# Altium footprint library HSD_connectors.PcbLib: 59 footprints (part 2 of 7)
Each footprint in its own frame and in the unit in brackets; x right, y up, seen from the top. Pads: shape width x height; smd on the part's side, far side on the other; paste and mask are expansions set on the pad; w line width, h text height; cw(c..) or ccw(c..) is an arc to the next point about the centre after c.
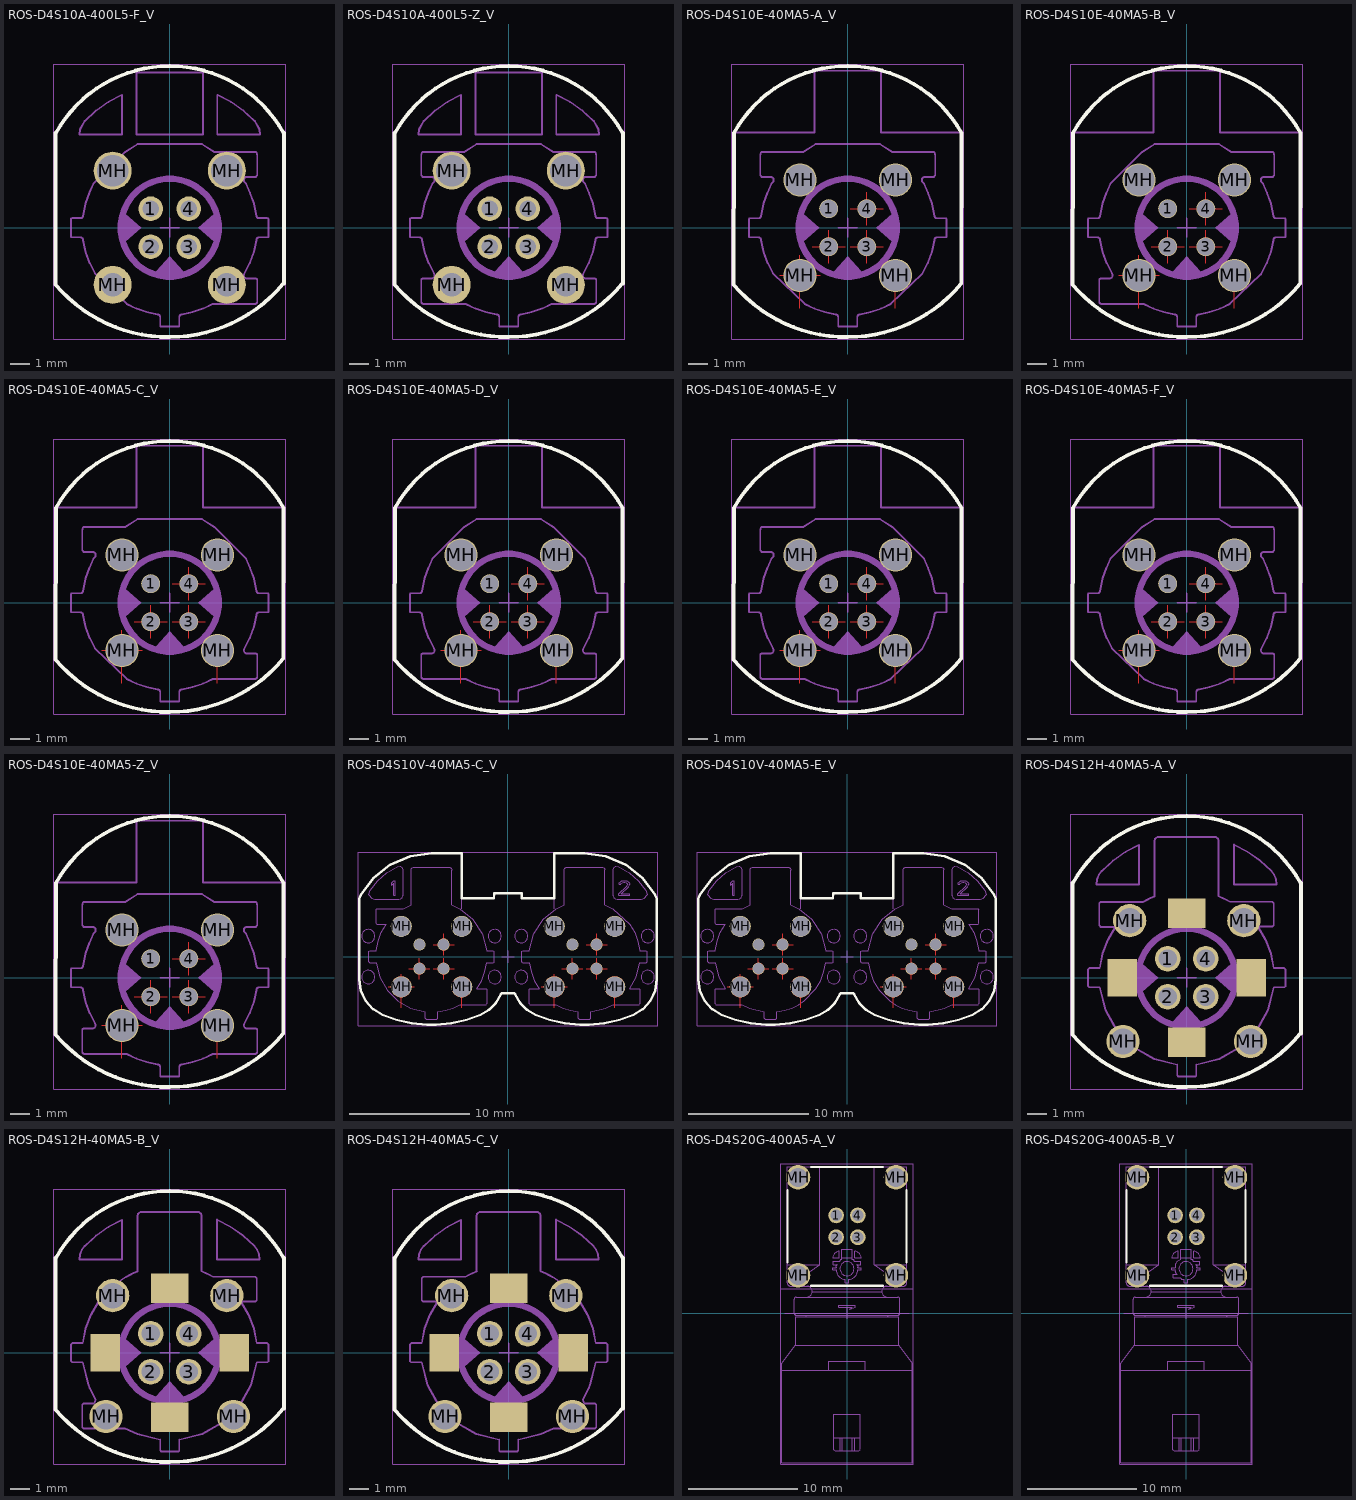
[diagram p1: the footprints below, top view; thin cyan lines are the x and y axes]

## ROS-D4S10A-400L5-F_V [mm] "HSD Straight Plug, 12x14.15x15.4mm, Rosenberger Recommended"
height 15.4
pads (8):
  round 1.3 hole 0.85: 1(-1,1) 2(-1,-1) 3(1,-1) 4(1,1)
  round 2 hole 1.25: MH(-3,-3) MH(3,-3)
  round 2 hole 1.65: MH(-3,3) MH(3,3)
Top Overlay:
  lines w0.2: -6,4.989 -6,-3 ccw(c-0.039,2.086) 5.965,-2.95 ; -5.98,4.989 cw(c0,1.651) 5.981,4.989 ; 6,-2.95 6,4.989
Mechanical 13:
  drawing of 99 lines, arcs and shapes, not listed
  text ".Designator" at -1.639,5.631 h2.69
Mechanical 15:
  lines w0.05: -6.1,-5.85 6.1,-5.85 6.1,8.6 -6.1,8.6 -6.1,-5.85
  lines w0.1: -0.5,0 0.5,0 ; 0,-0.5 0,0.5
3D body "d4s10a-400L5-F.stp": height 15.25, standoff -3.5, extent -5.999,-5.649 6.001,8.501

## ROS-D4S10A-400L5-Z_V [mm] "HSD Straight Plug, 12x14.15x15.4mm, Rosenberger Recommended"
height 15.4
pads (8):
  round 1.3 hole 0.85: 1(-1,1) 2(-1,-1) 3(1,-1) 4(1,1)
  round 2 hole 1.25: MH(-3,-3) MH(3,-3)
  round 2 hole 1.65: MH(-3,3) MH(3,3)
Top Overlay:
  lines w0.2: -6,4.989 -6,-3 ccw(c-0.039,2.086) 5.965,-2.95 ; -5.98,4.989 cw(c0,1.651) 5.981,4.989 ; 6,-2.95 6,4.989
Mechanical 13:
  drawing of 123 lines, arcs and shapes, not listed
  text ".Designator" at -1.639,5.758 h2.69
Mechanical 15:
  lines w0.05: -6.1,-5.85 -6.1,8.6 6.1,8.6 6.1,-5.85 -6.1,-5.85
  lines w0.1: -0.5,0 0.5,0 ; 0,-0.5 0,0.5
3D body "d4s10a-400L5-Z.stp": height 15.25, standoff -3.5, extent -5.999,-5.649 6.001,8.501

## ROS-D4S10E-40MA5-A_V [mm] "HSD Straight Plug, Pin in Paste, 14.15x12.00x15.40 mm, Rosenberger Recommended"
height 15.4
pads (8):
  round 1 hole 0.9: 1(-1,1) 2(-1,-1) 3(1,-1) 4(1,1)
  round 1.75 hole 1.65: MH(-2.51,-2.51) MH(-2.51,2.51) MH(2.51,-2.51) MH(2.51,2.51)
Top Layer:
  lines w0.043: -3.57,-2.51 -3.335,-2.51 ; -2.51,-4.24 -2.51,-3.335 ; -2.51,-1.685 -2.51,-1.45 ; -1.875,-1 -1.45,-1 ; -1.685,-2.51 -1.45,-2.51 ; -1,-1.875 -1,-1.45 ; -1,-0.55 -1,-0.125 ; -0.55,-1 -0.125,-1 ; 0.125,-1 0.55,-1 ; 0.125,1 0.55,1 ; 1,-1.875 1,-1.45 ; 1,-0.55 1,-0.125 ; 1,0.125 1,0.55 ; 1,1.45 1,1.875 ; 1.45,-1 1.875,-1 ; 1.45,1 1.875,1 ; 2.51,-4.24 2.51,-3.335 ; -3.325,-2.51 ccw(c-2.51,-2.51) -2.51,-3.325 ccw(c-2.51,-2.51) -1.695,-2.51 ccw(c-2.51,-2.51) -2.51,-1.695 ccw(c-2.51,-2.51) -3.325,-2.51 ; -1.44,-1 ccw(c-1,-1) -1,-1.44 ccw(c-1,-1) -0.56,-1 ccw(c-1,-1) -1,-0.56 ccw(c-1,-1) -1.44,-1 ; 0.56,-1 ccw(c1,-1) 1,-1.44 ccw(c1,-1) 1.44,-1 ccw(c1,-1) 1,-0.56 ccw(c1,-1) 0.56,-1 ; 0.56,1 cw(c1,1) 1,1.44 cw(c1,1) 1.44,1 cw(c1,1) 1,0.56 cw(c1,1) 0.56,1 ; 1.695,-2.51 cw(c2.51,-2.51) 2.51,-1.695 cw(c2.51,-2.51) 3.325,-2.51 cw(c2.51,-2.51) 2.51,-3.325 cw(c2.51,-2.51) 1.695,-2.51
Top Overlay:
  lines w0.2: -6,-3 ccw(c-0.039,2.086) 5.965,-2.95 5.981,4.989 ccw(c0,1.651) -5.98,4.989 -6,-3
Top Paste:
  drawing of 113 lines, arcs and shapes, not listed
Bottom Solder:
  drawing of 152 lines, arcs and shapes, not listed
Mechanical 13:
  drawing of 86 lines, arcs and shapes, not listed
  text ".Designator" at -1.512,5.885 h2.69
Mechanical 15:
  lines w0.05: -6.1,-5.85 6.1,-5.85 6.1,8.6 -6.1,8.6 -6.1,-5.85
  lines w0.1: -0.5,0 0.5,0 ; 0,-0.5 0,0.5
Multi-Layer:
  drawing of 105 lines, arcs and shapes, not listed
3D body "d4s10e-40mA5-A.stp": height 15.4, standoff -2.6, extent -6,-5.65 6,8.5

## ROS-D4S10E-40MA5-B_V [mm] "HSD Straight Plug, Pin in Paste, 14.15x12.00x15.40 mm, Rosenberger Recommended"
height 15.4
pads (8):
  round 1 hole 0.9: 1(-1,1) 2(-1,-1) 3(1,-1) 4(1,1)
  round 1.75 hole 1.65: MH(-2.51,-2.51) MH(-2.51,2.51) MH(2.51,-2.51) MH(2.51,2.51)
Top Layer:
  lines w0.043: -3.57,-2.51 -3.335,-2.51 ; -2.51,-4.24 -2.51,-3.335 ; -2.51,-1.685 -2.51,-1.45 ; -1.875,-1 -1.45,-1 ; -1.685,-2.51 -1.45,-2.51 ; -1,-1.875 -1,-1.45 ; -1,-0.55 -1,-0.125 ; -0.55,-1 -0.125,-1 ; 0.125,-1 0.55,-1 ; 0.125,1 0.55,1 ; 1,-1.875 1,-1.45 ; 1,-0.55 1,-0.125 ; 1,0.125 1,0.55 ; 1,1.45 1,1.875 ; 1.45,-1 1.875,-1 ; 1.45,1 1.875,1 ; 2.51,-4.24 2.51,-3.335 ; -3.325,-2.51 cw(c-2.51,-2.51) -2.51,-1.695 cw(c-2.51,-2.51) -1.695,-2.51 cw(c-2.51,-2.51) -2.51,-3.325 cw(c-2.51,-2.51) -3.325,-2.51 ; -1.44,-1 cw(c-1,-1) -1,-0.56 cw(c-1,-1) -0.56,-1 cw(c-1,-1) -1,-1.44 cw(c-1,-1) -1.44,-1 ; 0.56,-1 cw(c1,-1) 1,-0.56 cw(c1,-1) 1.44,-1 cw(c1,-1) 1,-1.44 cw(c1,-1) 0.56,-1 ; 0.56,1 ccw(c1,1) 1,0.56 ccw(c1,1) 1.44,1 ccw(c1,1) 1,1.44 ccw(c1,1) 0.56,1 ; 1.695,-2.51 ccw(c2.51,-2.51) 2.51,-3.325 ccw(c2.51,-2.51) 3.325,-2.51 ccw(c2.51,-2.51) 2.51,-1.695 ccw(c2.51,-2.51) 1.695,-2.51
Top Overlay:
  lines w0.2: -6,-3 ccw(c-0.039,2.086) 5.965,-2.95 5.981,4.989 ccw(c0,1.651) -5.98,4.989 -6,-3
Top Paste:
  drawing of 113 lines, arcs and shapes, not listed
Bottom Solder:
  drawing of 152 lines, arcs and shapes, not listed
Mechanical 13:
  drawing of 87 lines, arcs and shapes, not listed
  text ".Designator" at -1.512,5.504 h2.69
Mechanical 15:
  lines w0.05: -6.1,-5.85 -6.1,8.6 6.1,8.6 6.1,-5.85 -6.1,-5.85
  lines w0.1: -0.5,0 0.5,0 ; 0,-0.5 0,0.5
Multi-Layer:
  drawing of 105 lines, arcs and shapes, not listed
3D body "d4s10e-40mA5-B.stp": height 15.4, standoff -2.6, extent -6,-5.65 6,8.5

## ROS-D4S10E-40MA5-C_V [mm] "HSD Straight Plug, Pin in Paste, 14.15x12.00x15.40 mm, Rosenberger Recommended"
height 15.4
pads (8):
  round 1 hole 0.9: 1(-1,1) 2(-1,-1) 3(1,-1) 4(1,1)
  round 1.75 hole 1.65: MH(-2.51,-2.51) MH(-2.51,2.51) MH(2.51,-2.51) MH(2.51,2.51)
Top Layer:
  lines w0.043: -3.57,-2.51 -3.335,-2.51 ; -2.51,-4.24 -2.51,-3.335 ; -2.51,-1.685 -2.51,-1.45 ; -1.875,-1 -1.45,-1 ; -1.685,-2.51 -1.45,-2.51 ; -1,-1.875 -1,-1.45 ; -1,-0.55 -1,-0.125 ; -0.55,-1 -0.125,-1 ; 0.125,-1 0.55,-1 ; 0.125,1 0.55,1 ; 1,-1.875 1,-1.45 ; 1,-0.55 1,-0.125 ; 1,0.125 1,0.55 ; 1,1.45 1,1.875 ; 1.45,-1 1.875,-1 ; 1.45,1 1.875,1 ; 2.51,-4.24 2.51,-3.335 ; -3.325,-2.51 ccw(c-2.51,-2.51) -2.51,-3.325 ccw(c-2.51,-2.51) -1.695,-2.51 ccw(c-2.51,-2.51) -2.51,-1.695 ccw(c-2.51,-2.51) -3.325,-2.51 ; -1.44,-1 ccw(c-1,-1) -1,-1.44 ccw(c-1,-1) -0.56,-1 ccw(c-1,-1) -1,-0.56 ccw(c-1,-1) -1.44,-1 ; 0.56,-1 ccw(c1,-1) 1,-1.44 ccw(c1,-1) 1.44,-1 ccw(c1,-1) 1,-0.56 ccw(c1,-1) 0.56,-1 ; 0.56,1 cw(c1,1) 1,1.44 cw(c1,1) 1.44,1 cw(c1,1) 1,0.56 cw(c1,1) 0.56,1 ; 1.695,-2.51 cw(c2.51,-2.51) 2.51,-1.695 cw(c2.51,-2.51) 3.325,-2.51 cw(c2.51,-2.51) 2.51,-3.325 cw(c2.51,-2.51) 1.695,-2.51
Top Overlay:
  lines w0.2: -6,-3 ccw(c-0.039,2.086) 5.965,-2.95 5.981,4.989 ccw(c0,1.651) -5.98,4.989 -6,-3
Top Paste:
  drawing of 113 lines, arcs and shapes, not listed
Bottom Solder:
  drawing of 152 lines, arcs and shapes, not listed
Mechanical 13:
  drawing of 86 lines, arcs and shapes, not listed
  text ".Designator" at -1.639,5.758 h2.69
Mechanical 15:
  lines w0.05: -6.1,-5.85 6.1,-5.85 6.1,8.6 -6.1,8.6 -6.1,-5.85
  lines w0.1: -0.5,0 0.5,0 ; 0,-0.5 0,0.5
Multi-Layer:
  drawing of 105 lines, arcs and shapes, not listed
3D body "d4s10e-40mA5-C.stp": height 15.4, standoff -2.6, extent -6,-5.65 6,8.5

## ROS-D4S10E-40MA5-D_V [mm] "HSD Straight Plug, Pin in Paste, 14.15x12.00x15.40 mm, Rosenberger Recommended"
height 15.4
pads (8):
  round 1 hole 0.9: 1(-1,1) 2(-1,-1) 3(1,-1) 4(1,1)
  round 1.75 hole 1.65: MH(-2.51,-2.51) MH(-2.51,2.51) MH(2.51,-2.51) MH(2.51,2.51)
Top Layer:
  lines w0.043: -3.57,-2.51 -3.335,-2.51 ; -2.51,-4.24 -2.51,-3.335 ; -2.51,-1.685 -2.51,-1.45 ; -1.875,-1 -1.45,-1 ; -1.685,-2.51 -1.45,-2.51 ; -1,-1.875 -1,-1.45 ; -1,-0.55 -1,-0.125 ; -0.55,-1 -0.125,-1 ; 0.125,-1 0.55,-1 ; 0.125,1 0.55,1 ; 1,-1.875 1,-1.45 ; 1,-0.55 1,-0.125 ; 1,0.125 1,0.55 ; 1,1.45 1,1.875 ; 1.45,-1 1.875,-1 ; 1.45,1 1.875,1 ; 2.51,-4.24 2.51,-3.335 ; -3.325,-2.51 cw(c-2.51,-2.51) -2.51,-1.695 cw(c-2.51,-2.51) -1.695,-2.51 cw(c-2.51,-2.51) -2.51,-3.325 cw(c-2.51,-2.51) -3.325,-2.51 ; -1.44,-1 cw(c-1,-1) -1,-0.56 cw(c-1,-1) -0.56,-1 cw(c-1,-1) -1,-1.44 cw(c-1,-1) -1.44,-1 ; 0.56,-1 cw(c1,-1) 1,-0.56 cw(c1,-1) 1.44,-1 cw(c1,-1) 1,-1.44 cw(c1,-1) 0.56,-1 ; 0.56,1 ccw(c1,1) 1,0.56 ccw(c1,1) 1.44,1 ccw(c1,1) 1,1.44 ccw(c1,1) 0.56,1 ; 1.695,-2.51 ccw(c2.51,-2.51) 2.51,-3.325 ccw(c2.51,-2.51) 3.325,-2.51 ccw(c2.51,-2.51) 2.51,-1.695 ccw(c2.51,-2.51) 1.695,-2.51
Top Overlay:
  lines w0.2: -6,-3 ccw(c-0.039,2.086) 5.965,-2.95 5.981,4.989 ccw(c0,1.651) -5.98,4.989 -6,-3
Top Paste:
  drawing of 113 lines, arcs and shapes, not listed
Bottom Solder:
  drawing of 152 lines, arcs and shapes, not listed
Mechanical 13:
  drawing of 86 lines, arcs and shapes, not listed
  text ".Designator" at -1.512,5.631 h2.69
Mechanical 15:
  lines w0.05: -6.1,-5.85 -6.1,8.6 6.1,8.6 6.1,-5.85 -6.1,-5.85
  lines w0.1: -0.5,0 0.5,0 ; 0,-0.5 0,0.5
Multi-Layer:
  drawing of 105 lines, arcs and shapes, not listed
3D body "d4s10e-40mA5-D.stp": height 15.4, standoff -2.6, extent -6,-5.65 6,8.5

## ROS-D4S10E-40MA5-E_V [mm] "HSD Straight Plug, Pin in Paste, 14.15x12.00x15.40 mm, Rosenberger Recommended"
height 15.4
pads (8):
  round 1 hole 0.9: 1(-1,1) 2(-1,-1) 3(1,-1) 4(1,1)
  round 1.75 hole 1.65: MH(-2.51,-2.51) MH(-2.51,2.51) MH(2.51,-2.51) MH(2.51,2.51)
Top Layer:
  lines w0.043: -3.57,-2.51 -3.335,-2.51 ; -2.51,-4.24 -2.51,-3.335 ; -2.51,-1.685 -2.51,-1.45 ; -1.875,-1 -1.45,-1 ; -1.685,-2.51 -1.45,-2.51 ; -1,-1.875 -1,-1.45 ; -1,-0.55 -1,-0.125 ; -0.55,-1 -0.125,-1 ; 0.125,-1 0.55,-1 ; 0.125,1 0.55,1 ; 1,-1.875 1,-1.45 ; 1,-0.55 1,-0.125 ; 1,0.125 1,0.55 ; 1,1.45 1,1.875 ; 1.45,-1 1.875,-1 ; 1.45,1 1.875,1 ; 2.51,-4.24 2.51,-3.335 ; -3.325,-2.51 cw(c-2.51,-2.51) -2.51,-1.695 cw(c-2.51,-2.51) -1.695,-2.51 cw(c-2.51,-2.51) -2.51,-3.325 cw(c-2.51,-2.51) -3.325,-2.51 ; -1.44,-1 cw(c-1,-1) -1,-0.56 cw(c-1,-1) -0.56,-1 cw(c-1,-1) -1,-1.44 cw(c-1,-1) -1.44,-1 ; 0.56,-1 cw(c1,-1) 1,-0.56 cw(c1,-1) 1.44,-1 cw(c1,-1) 1,-1.44 cw(c1,-1) 0.56,-1 ; 0.56,1 ccw(c1,1) 1,0.56 ccw(c1,1) 1.44,1 ccw(c1,1) 1,1.44 ccw(c1,1) 0.56,1 ; 1.695,-2.51 ccw(c2.51,-2.51) 2.51,-3.325 ccw(c2.51,-2.51) 3.325,-2.51 ccw(c2.51,-2.51) 2.51,-1.695 ccw(c2.51,-2.51) 1.695,-2.51
Top Overlay:
  lines w0.2: -6,-3 ccw(c-0.039,2.086) 5.965,-2.95 5.981,4.989 ccw(c0,1.651) -5.98,4.989 -6,-3
Top Paste:
  drawing of 113 lines, arcs and shapes, not listed
Bottom Solder:
  drawing of 152 lines, arcs and shapes, not listed
Mechanical 13:
  drawing of 86 lines, arcs and shapes, not listed
  text ".Designator" at -1.639,5.25 h2.69
Mechanical 15:
  lines w0.05: -6.1,-5.85 -6.1,8.6 6.1,8.6 6.1,-5.85 -6.1,-5.85
  lines w0.1: -0.5,0 0.5,0 ; 0,-0.5 0,0.5
Multi-Layer:
  drawing of 105 lines, arcs and shapes, not listed
3D body "d4s10e-40mxx-Z_130307.stp": height 15.4, standoff -2.6, extent -6,-5.65 6,8.5

## ROS-D4S10E-40MA5-F_V [mm] "HSD Straight Plug, Pin in Paste, 14.15x12.00x15.40 mm, Rosenberger Recommended"
height 15.4
pads (8):
  round 1 hole 0.9: 1(-1,1) 2(-1,-1) 3(1,-1) 4(1,1)
  round 1.75 hole 1.65: MH(-2.51,-2.51) MH(-2.51,2.51) MH(2.51,-2.51) MH(2.51,2.51)
Top Layer:
  lines w0.043: -3.57,-2.51 -3.335,-2.51 ; -2.51,-4.24 -2.51,-3.335 ; -2.51,-1.685 -2.51,-1.45 ; -1.875,-1 -1.45,-1 ; -1.685,-2.51 -1.45,-2.51 ; -1,-1.875 -1,-1.45 ; -1,-0.55 -1,-0.125 ; -0.55,-1 -0.125,-1 ; 0.125,-1 0.55,-1 ; 0.125,1 0.55,1 ; 1,-1.875 1,-1.45 ; 1,-0.55 1,-0.125 ; 1,0.125 1,0.55 ; 1,1.45 1,1.875 ; 1.45,-1 1.875,-1 ; 1.45,1 1.875,1 ; 2.51,-4.24 2.51,-3.335 ; -3.325,-2.51 cw(c-2.51,-2.51) -2.51,-1.695 cw(c-2.51,-2.51) -1.695,-2.51 cw(c-2.51,-2.51) -2.51,-3.325 cw(c-2.51,-2.51) -3.325,-2.51 ; -1.44,-1 cw(c-1,-1) -1,-0.56 cw(c-1,-1) -0.56,-1 cw(c-1,-1) -1,-1.44 cw(c-1,-1) -1.44,-1 ; 0.56,-1 cw(c1,-1) 1,-0.56 cw(c1,-1) 1.44,-1 cw(c1,-1) 1,-1.44 cw(c1,-1) 0.56,-1 ; 0.56,1 ccw(c1,1) 1,0.56 ccw(c1,1) 1.44,1 ccw(c1,1) 1,1.44 ccw(c1,1) 0.56,1 ; 1.695,-2.51 ccw(c2.51,-2.51) 2.51,-3.325 ccw(c2.51,-2.51) 3.325,-2.51 ccw(c2.51,-2.51) 2.51,-1.695 ccw(c2.51,-2.51) 1.695,-2.51
Top Overlay:
  lines w0.2: -6,-3 ccw(c-0.039,2.086) 5.965,-2.95 5.981,4.989 ccw(c0,1.651) -5.98,4.989 -6,-3
Top Paste:
  drawing of 113 lines, arcs and shapes, not listed
Bottom Solder:
  drawing of 152 lines, arcs and shapes, not listed
Mechanical 13:
  drawing of 86 lines, arcs and shapes, not listed
  text ".Designator" at -1.512,5.631 h2.69
Mechanical 15:
  lines w0.05: -6.1,-5.85 -6.1,8.6 6.1,8.6 6.1,-5.85 -6.1,-5.85
  lines w0.1: -0.5,0 0.5,0 ; 0,-0.5 0,0.5
Multi-Layer:
  drawing of 105 lines, arcs and shapes, not listed
3D body "d4s10e-40mxx-Z_130307.stp": height 15.4, standoff -2.6, extent -6,-5.65 6,8.5

## ROS-D4S10E-40MA5-Z_V [mm] "HSD Straight Plug, Pin in Paste, 14.15x12.00x15.40 mm, Rosenberger Recommended"
height 15.4
pads (8):
  round 1 hole 0.9: 1(-1,1) 2(-1,-1) 3(1,-1) 4(1,1)
  round 1.75 hole 1.65: MH(-2.51,-2.51) MH(-2.51,2.51) MH(2.51,-2.51) MH(2.51,2.51)
Top Layer:
  lines w0.043: -3.57,-2.51 -3.335,-2.51 ; -2.51,-4.24 -2.51,-3.335 ; -2.51,-1.685 -2.51,-1.45 ; -1.875,-1 -1.45,-1 ; -1.685,-2.51 -1.45,-2.51 ; -1,-1.875 -1,-1.45 ; -1,-0.55 -1,-0.125 ; -0.55,-1 -0.125,-1 ; 0.125,-1 0.55,-1 ; 0.125,1 0.55,1 ; 1,-1.875 1,-1.45 ; 1,-0.55 1,-0.125 ; 1,0.125 1,0.55 ; 1,1.45 1,1.875 ; 1.45,-1 1.875,-1 ; 1.45,1 1.875,1 ; 2.51,-4.24 2.51,-3.335 ; -3.325,-2.51 ccw(c-2.51,-2.51) -2.51,-3.325 ccw(c-2.51,-2.51) -1.695,-2.51 ccw(c-2.51,-2.51) -2.51,-1.695 ccw(c-2.51,-2.51) -3.325,-2.51 ; -1.44,-1 ccw(c-1,-1) -1,-1.44 ccw(c-1,-1) -0.56,-1 ccw(c-1,-1) -1,-0.56 ccw(c-1,-1) -1.44,-1 ; 0.56,-1 ccw(c1,-1) 1,-1.44 ccw(c1,-1) 1.44,-1 ccw(c1,-1) 1,-0.56 ccw(c1,-1) 0.56,-1 ; 0.56,1 cw(c1,1) 1,1.44 cw(c1,1) 1.44,1 cw(c1,1) 1,0.56 cw(c1,1) 0.56,1 ; 1.695,-2.51 cw(c2.51,-2.51) 2.51,-1.695 cw(c2.51,-2.51) 3.325,-2.51 cw(c2.51,-2.51) 2.51,-3.325 cw(c2.51,-2.51) 1.695,-2.51
Top Overlay:
  lines w0.2: -6,-3 ccw(c-0.039,2.086) 5.965,-2.95 5.981,4.989 ccw(c0,1.651) -5.98,4.989 -6,-3
Top Paste:
  drawing of 113 lines, arcs and shapes, not listed
Bottom Solder:
  drawing of 152 lines, arcs and shapes, not listed
Mechanical 13:
  drawing of 110 lines, arcs and shapes, not listed
  text ".Designator" at -1.639,5.25 h2.69
Mechanical 15:
  lines w0.05: -6.1,-5.85 6.1,-5.85 6.1,8.6 -6.1,8.6 -6.1,-5.85
  lines w0.1: -0.5,0 0.5,0 ; 0,-0.5 0,0.5
Multi-Layer:
  drawing of 105 lines, arcs and shapes, not listed
3D body "d4s10e-40mA5-Z.stp": height 15.4, standoff -2.6, extent -6,-5.65 6,8.5

## ROS-D4S10V-40MA5-C_V [mm] "Dual HSD Straight Plug, Pin in Paste, 24.7x14.22x15.4mm, Rosenberger Recommended"
height 15.4
pads (16):
  round 1 hole 0.9: 1_1(-7.35,1) 1_2(-7.35,-1) 1_3(-5.35,-1) 1_4(-5.35,1) 2_1(5.35,1) 2_2(5.35,-1) 2_3(7.35,-1) 2_4(7.35,1)
  round 1.75 hole 1.65: MH(-8.86,-2.51) MH(-8.86,2.51) MH(-3.84,-2.51) MH(-3.84,2.51) MH(3.84,-2.51) MH(3.84,2.51) MH(8.86,-2.51) MH(8.86,2.51)
Top Layer:
  lines w0.043: -9.92,-2.51 -9.685,-2.51 ; -8.86,-4.24 -8.86,-3.335 ; -8.86,-1.685 -8.86,-1.45 ; -8.225,-1 -7.8,-1 ; -8.035,-2.51 -7.8,-2.51 ; -7.35,-1.875 -7.35,-1.45 ; -7.35,-0.55 -7.35,-0.125 ; -6.9,-1 -6.475,-1 ; -6.225,-1 -5.8,-1 ; -6.225,1 -5.8,1 ; -5.35,-1.875 -5.35,-1.45 ; -5.35,-0.55 -5.35,-0.125 ; -5.35,0.125 -5.35,0.55 ; -5.35,1.45 -5.35,1.875 ; -4.9,-1 -4.475,-1 ; -4.9,1 -4.475,1 ; -3.84,-4.24 -3.84,-3.335 ; 2.78,-2.51 3.015,-2.51 ; 3.84,-4.24 3.84,-3.335 ; 3.84,-1.685 3.84,-1.45 ; 4.475,-1 4.9,-1 ; 4.665,-2.51 4.9,-2.51 ; 5.35,-1.875 5.35,-1.45 ; 5.35,-0.55 5.35,-0.125 ; 5.8,-1 6.225,-1 ; 6.475,-1 6.9,-1 ; 6.475,1 6.9,1 ; 7.35,-1.875 7.35,-1.45 ; 7.35,-0.55 7.35,-0.125 ; 7.35,0.125 7.35,0.55 ; 7.35,1.45 7.35,1.875 ; 7.8,-1 8.225,-1 ; 7.8,1 8.225,1 ; 8.86,-4.24 8.86,-3.335 ; -9.675,-2.51 cw(c-8.86,-2.51) -8.86,-1.695 cw(c-8.86,-2.51) -8.045,-2.51 cw(c-8.86,-2.51) -8.86,-3.325 cw(c-8.86,-2.51) -9.675,-2.51 ; -7.79,-1 cw(c-7.35,-1) -7.35,-0.56 cw(c-7.35,-1) -6.91,-1 cw(c-7.35,-1) -7.35,-1.44 cw(c-7.35,-1) -7.79,-1 ; -5.79,-1 cw(c-5.35,-1) -5.35,-0.56 cw(c-5.35,-1) -4.91,-1 cw(c-5.35,-1) -5.35,-1.44 cw(c-5.35,-1) -5.79,-1 ; -5.79,1 ccw(c-5.35,1) -5.35,0.56 ccw(c-5.35,1) -4.91,1 ccw(c-5.35,1) -5.35,1.44 ccw(c-5.35,1) -5.79,1 ; -4.655,-2.51 ccw(c-3.84,-2.51) -3.84,-3.325 ccw(c-3.84,-2.51) -3.025,-2.51 ccw(c-3.84,-2.51) -3.84,-1.695 ccw(c-3.84,-2.51) -4.655,-2.51 ; 3.025,-2.51 cw(c3.84,-2.51) 3.84,-1.695 cw(c3.84,-2.51) 4.655,-2.51 cw(c3.84,-2.51) 3.84,-3.325 cw(c3.84,-2.51) 3.025,-2.51 ; 4.91,-1 cw(c5.35,-1) 5.35,-0.56 cw(c5.35,-1) 5.79,-1 cw(c5.35,-1) 5.35,-1.44 cw(c5.35,-1) 4.91,-1 ; 6.91,-1 cw(c7.35,-1) 7.35,-0.56 cw(c7.35,-1) 7.79,-1 cw(c7.35,-1) 7.35,-1.44 cw(c7.35,-1) 6.91,-1 ; 6.91,1 ccw(c7.35,1) 7.35,0.56 ccw(c7.35,1) 7.79,1 ccw(c7.35,1) 7.35,1.44 ccw(c7.35,1) 6.91,1 ; 8.045,-2.51 ccw(c8.86,-2.51) 8.86,-3.325 ccw(c8.86,-2.51) 9.675,-2.51 ccw(c8.86,-2.51) 8.86,-1.695 ccw(c8.86,-2.51) 8.045,-2.51
Top Overlay:
  lines w0.2: 1.142,5.249 1.152,4.849 1.742,4.849 3.842,4.849 ; 1.15,5.249 -1.151,5.249 -1.161,4.849 -1.75,4.849 -3.851,4.849 -3.851,6.649 -3.851,6.796 -3.851,8.568 -6.351,8.568 -8.121,8.33 -9.766,7.632 -11.168,6.524 -12.228,5.085 -12.295,4.932 -12.337,4.771 -12.351,-1.901 -12.214,-2.824 -11.817,-3.669 -11.193,-4.364 -10.395,-4.849 -9.208,-5.266 -7.978,-5.535 -6.726,-5.651 -5.975,-5.651 -4.723,-5.535 -3.493,-5.266 -2.306,-4.849 -1.591,-4.43 -1.007,-3.842 -0.594,-3.124 -0.52,-3.034 ; 3.851,4.849 3.851,6.649 3.851,6.796 3.851,8.568 6.351,8.568 8.121,8.33 9.766,7.632 11.168,6.524 12.228,5.085 12.295,4.932 12.337,4.771 ; 12.351,4.771 12.351,-1.901 12.214,-2.824 11.817,-3.669 11.193,-4.364 10.395,-4.849 9.208,-5.266 7.978,-5.535 6.726,-5.651 5.975,-5.651 4.723,-5.535 3.493,-5.266 2.306,-4.849 1.591,-4.43 1.007,-3.842 0.594,-3.124 0.52,-3.034 ; -0.519,-3.034 0.52,-3.034 ; -0.52,-3.034 0.519,-3.034
Top Paste:
  drawing of 226 lines, arcs and shapes, not listed
Mechanical 13:
  drawing of 261 lines, arcs and shapes, not listed
  text ".Designator" at -3.036,5.885 h2.69
  text "1" at -11.677,1.471 h0.5
  text "2" at -11.778,-1.933 h0.5
  text "4" at -1.288,1.445 h0.5
  text "3" at -1.263,-1.933 h0.5
  text "1" at 1.023,1.471 h0.5
  text "3" at 11.437,-1.933 h0.5
  text "4" at 11.412,1.445 h0.5
  text "2" at 0.922,-1.933 h0.5
Mechanical 15:
  lines w0.05: -12.45,-5.75 -12.45,8.668 12.451,8.668 12.451,-5.75 -12.45,-5.75
  lines w0.1: -0.5,0 0.508,0 ; 0.004,-0.504 0.004,0.504
Multi-Layer:
  drawing of 210 lines, arcs and shapes, not listed
3D body "d4s10v-40mA5-C.stp": height 15.4, standoff -2.6, extent -12.35,-5.65 12.35,8.568

## ROS-D4S10V-40MA5-E_V [mm] "Dual HSD Straight Plug, Pin in Paste, 24.7x14.22x15.4mm, Rosenberger Recommended"
height 15.4
pads (16):
  round 1 hole 0.9: 1_1(-7.354,1) 1_2(-7.354,-1) 1_3(-5.354,-1) 1_4(-5.354,1) 2_1(5.346,1) 2_2(5.346,-1) 2_3(7.346,-1) 2_4(7.346,1)
  round 1.75 hole 1.65: MH(-8.864,-2.51) MH(-8.864,2.51) MH(-3.844,-2.51) MH(-3.844,2.51) MH(3.836,-2.51) MH(3.836,2.51) MH(8.856,-2.51) MH(8.856,2.51)
Top Layer:
  lines w0.043: -9.924,-2.51 -9.689,-2.51 ; -8.864,-4.24 -8.864,-3.335 ; -8.864,-1.685 -8.864,-1.45 ; -8.229,-1 -7.804,-1 ; -8.039,-2.51 -7.804,-2.51 ; -7.354,-1.875 -7.354,-1.45 ; -7.354,-0.55 -7.354,-0.125 ; -6.904,-1 -6.479,-1 ; -6.229,-1 -5.804,-1 ; -6.229,1 -5.804,1 ; -5.354,-1.875 -5.354,-1.45 ; -5.354,-0.55 -5.354,-0.125 ; -5.354,0.125 -5.354,0.55 ; -5.354,1.45 -5.354,1.875 ; -4.904,-1 -4.479,-1 ; -4.904,1 -4.479,1 ; -3.844,-4.24 -3.844,-3.335 ; 2.776,-2.51 3.011,-2.51 ; 3.836,-4.24 3.836,-3.335 ; 3.836,-1.685 3.836,-1.45 ; 4.471,-1 4.896,-1 ; 4.661,-2.51 4.896,-2.51 ; 5.346,-1.875 5.346,-1.45 ; 5.346,-0.55 5.346,-0.125 ; 5.796,-1 6.221,-1 ; 6.471,-1 6.896,-1 ; 6.471,1 6.896,1 ; 7.346,-1.875 7.346,-1.45 ; 7.346,-0.55 7.346,-0.125 ; 7.346,0.125 7.346,0.55 ; 7.346,1.45 7.346,1.875 ; 7.796,-1 8.221,-1 ; 7.796,1 8.221,1 ; 8.856,-4.24 8.856,-3.335 ; -9.679,-2.51 ccw(c-8.864,-2.51) -8.864,-3.325 ccw(c-8.864,-2.51) -8.049,-2.51 ccw(c-8.864,-2.51) -8.864,-1.695 ccw(c-8.864,-2.51) -9.679,-2.51 ; -7.794,-1 ccw(c-7.354,-1) -7.354,-1.44 ccw(c-7.354,-1) -6.914,-1 ccw(c-7.354,-1) -7.354,-0.56 ccw(c-7.354,-1) -7.794,-1 ; -5.794,-1 ccw(c-5.354,-1) -5.354,-1.44 ccw(c-5.354,-1) -4.914,-1 ccw(c-5.354,-1) -5.354,-0.56 ccw(c-5.354,-1) -5.794,-1 ; -5.794,1 cw(c-5.354,1) -5.354,1.44 cw(c-5.354,1) -4.914,1 cw(c-5.354,1) -5.354,0.56 cw(c-5.354,1) -5.794,1 ; -4.659,-2.51 cw(c-3.844,-2.51) -3.844,-1.695 cw(c-3.844,-2.51) -3.029,-2.51 cw(c-3.844,-2.51) -3.844,-3.325 cw(c-3.844,-2.51) -4.659,-2.51 ; 3.021,-2.51 ccw(c3.836,-2.51) 3.836,-3.325 ccw(c3.836,-2.51) 4.651,-2.51 ccw(c3.836,-2.51) 3.836,-1.695 ccw(c3.836,-2.51) 3.021,-2.51 ; 4.906,-1 ccw(c5.346,-1) 5.346,-1.44 ccw(c5.346,-1) 5.786,-1 ccw(c5.346,-1) 5.346,-0.56 ccw(c5.346,-1) 4.906,-1 ; 6.906,-1 ccw(c7.346,-1) 7.346,-1.44 ccw(c7.346,-1) 7.786,-1 ccw(c7.346,-1) 7.346,-0.56 ccw(c7.346,-1) 6.906,-1 ; 6.906,1 cw(c7.346,1) 7.346,1.44 cw(c7.346,1) 7.786,1 cw(c7.346,1) 7.346,0.56 cw(c7.346,1) 6.906,1 ; 8.041,-2.51 cw(c8.856,-2.51) 8.856,-1.695 cw(c8.856,-2.51) 9.671,-2.51 cw(c8.856,-2.51) 8.856,-3.325 cw(c8.856,-2.51) 8.041,-2.51
Top Overlay:
  lines w0.2: -0.523,-3.034 0.516,-3.034 0.59,-3.124 1.003,-3.842 1.587,-4.43 2.302,-4.849 3.489,-5.266 4.719,-5.535 5.971,-5.651 6.722,-5.651 7.974,-5.535 9.204,-5.266 10.391,-4.849 11.189,-4.364 11.813,-3.669 12.21,-2.824 12.347,-1.901 12.347,4.771 ; 0.515,-3.034 -0.524,-3.034 -0.598,-3.124 -1.011,-3.842 -1.595,-4.43 -2.31,-4.849 -3.497,-5.266 -4.727,-5.535 -5.98,-5.651 -6.73,-5.651 -7.982,-5.535 -9.212,-5.266 -10.399,-4.849 -11.197,-4.364 -11.821,-3.669 -12.218,-2.824 -12.355,-1.901 -12.341,4.771 -12.299,4.932 -12.232,5.085 -11.172,6.524 -9.77,7.632 -8.125,8.33 -6.355,8.568 -3.855,8.568 -3.855,6.796 -3.855,6.649 -3.855,4.849 -1.754,4.849 -1.165,4.849 -1.155,5.249 1.146,5.249 ; 1.138,5.249 1.148,4.849 1.738,4.849 3.838,4.849 ; 3.847,4.849 3.847,6.649 3.847,6.796 3.847,8.568 6.347,8.568 8.117,8.33 9.762,7.632 11.164,6.524 12.224,5.085 12.291,4.932 12.333,4.771
Top Paste:
  drawing of 226 lines, arcs and shapes, not listed
Mechanical 13:
  drawing of 265 lines, arcs and shapes, not listed
  text ".Designator" at -3.163,6.139 h2.69
  text "2" at 0.918,-1.933 h0.5
  text "4" at 11.408,1.445 h0.5
  text "3" at 11.433,-1.933 h0.5
  text "1" at 1.019,1.471 h0.5
  text "3" at -1.267,-1.933 h0.5
  text "4" at -1.292,1.445 h0.5
  text "2" at -11.782,-1.933 h0.5
  text "1" at -11.681,1.471 h0.5
Mechanical 15:
  lines w0.05: -12.454,-5.75 -12.454,8.668 12.447,8.668 12.447,-5.75 -12.454,-5.75
  lines w0.1: -0.504,0 0.504,0 ; 0,-0.504 0,0.504
Multi-Layer:
  drawing of 210 lines, arcs and shapes, not listed
3D body "d4s10v-40mA5-E.stp": height 15.4, standoff -2.6, extent -12.354,-5.65 12.346,8.568

## ROS-D4S12H-40MA5-A_V [mm] "HSD Straight Plug, 12x14.15x15.45mm, Rosenberger Recommended"
height 15.45
pads (12):
  round 1.35 hole 0.95: 1(-1,1) 2(-1,-1) 3(1,-1) 4(1,1)
  round 1.75 hole 1.35: MH(-3.35,-3.35) MH(-3,3) MH(3,3) MH(3.35,-3.35)
  rect 1.55x1.95 smd: ""(-3.4,0) ""(3.4,0)
  rect 1.95x1.55 smd: ""(0,-3.4) ""(0,3.4)
Top Overlay:
  lines w0.2: -6,4.989 -6,-3 ccw(c-0.039,2.086) 5.965,-2.95 ; -5.98,4.989 cw(c0,1.651) 5.981,4.989 ; 6,-2.95 6,4.989
Top Paste:
  drawing of 8 lines, arcs and shapes, not listed
Mechanical 13:
  drawing of 75 lines, arcs and shapes, not listed
  text ".Designator" at -1.639,5.25 h2.69
Mechanical 15:
  lines w0.05: -6.1,-5.85 6.1,-5.85 6.1,8.6 -6.1,8.6 -6.1,-5.85
  lines w0.1: -0.5,0 0.5,0 ; 0,-0.5 0,0.5
3D body "d4s12h-40mA5-A.stp": height 15.45, standoff -2.05, extent -5.999,-5.649 6.001,8.501

## ROS-D4S12H-40MA5-B_V [mm] "HSD Straight Plug, 12x14.15x15.45mm, Rosenberger Recommended"
height 15.45
pads (12):
  round 1.35 hole 0.95: 1(-1,1) 2(-1,-1) 3(1,-1) 4(1,1)
  round 1.75 hole 1.35: MH(-3.35,-3.35) MH(-3,3) MH(3,3) MH(3.35,-3.35)
  rect 1.55x1.95 smd: ""(-3.4,0) ""(3.4,0)
  rect 1.95x1.55 smd: ""(0,-3.4) ""(0,3.4)
Top Overlay:
  lines w0.2: -6,4.989 -6,-3 ccw(c-0.039,2.086) 5.965,-2.95 ; -5.98,4.989 cw(c0,1.651) 5.981,4.989 ; 6,-2.95 6,4.989
Top Paste:
  drawing of 8 lines, arcs and shapes, not listed
Mechanical 13:
  drawing of 82 lines, arcs and shapes, not listed
  text ".Designator" at -1.639,5.25 h2.69
Mechanical 15:
  lines w0.05: -6.1,-5.85 6.1,-5.85 6.1,8.6 -6.1,8.6 -6.1,-5.85
  lines w0.1: -0.5,0 0.5,0 ; 0,-0.5 0,0.5
3D body "d4s12h-40mA5-B.stp": height 15.45, standoff -2.05, extent -6,-5.65 6,8.5

## ROS-D4S12H-40MA5-C_V [mm] "HSD Straight Plug, 12x14.15x15.45mm, Rosenberger Recommended"
height 15.45
pads (12):
  round 1.35 hole 0.95: 1(-1,1) 2(-1,-1) 3(1,-1) 4(1,1)
  round 1.75 hole 1.35: MH(-3.35,-3.35) MH(-3,3) MH(3,3) MH(3.35,-3.35)
  rect 1.55x1.95 smd: ""(-3.4,0) ""(3.4,0)
  rect 1.95x1.55 smd: ""(0,-3.4) ""(0,3.4)
Top Overlay:
  lines w0.2: -6,4.989 -6,-3 ccw(c-0.039,2.086) 5.965,-2.95 ; -5.98,4.989 cw(c0,1.651) 5.981,4.989 ; 6,-2.95 6,4.989
Top Paste:
  drawing of 8 lines, arcs and shapes, not listed
Mechanical 13:
  drawing of 82 lines, arcs and shapes, not listed
  text ".Designator" at -1.512,5.123 h2.69
Mechanical 15:
  lines w0.05: -6.1,-5.85 6.1,-5.85 6.1,8.6 -6.1,8.6 -6.1,-5.85
  lines w0.1: -0.5,0 0.5,0 ; 0,-0.5 0,0.5
3D body "d4s12h-40mA5-C.stp": height 15.45, standoff -2.05, extent -5.999,-5.649 6.001,8.501

## ROS-D4S20G-400A5-A_V [mm] "HSD Right Angle Plug, 27.2x12x10.6mm, Rosenberger Recommended"
height 10.6
pads (8):
  round 1.45 hole 1.05: 1(-1,9) 2(-1,7) 3(1,7) 4(1,9)
  round 2.25 hole 1.75: MH(-4.5,3.5) MH(-4.5,12.5) MH(4.5,3.5) MH(4.5,12.5)
Top Overlay:
  lines w0.2: -5.461,4.684 -5.461,11.316 ; -3.316,2.539 3.316,2.539 ; -3.316,13.461 3.316,13.461 ; 5.461,4.684 5.461,11.316
Mechanical 3:
  lines w0.1: -5.7,0 5.7,0
  text "Board Edge" at -5.5,-0.4 h0.2
Mechanical 13:
  circle w0.1: c-0.002,4.102 r0.65
  lines w0.1: -5.958,-5.25 -1.7,-5.25 ; -4.025,2.5 -4.025,3.411 ; -3.853,-0.2 -3.734,-0.3 ; -3.7,2.5 cw(c-3.7,2) -3.7,1.5 ; -3.19,2.006 3.185,2.006 ; -2.507,4.444 -5.5,4.45 ; -2.498,13.45 -2.498,4.45 -4.025,3.411 ; -1.2,-11.45 1.185,-11.45 cw(c1.185,-11.472) 1.2,-11.456 ; -0.65,-11.45 -0.648,-12.647 ; -0.424,-12.653 -0.422,-11.456 ; 0.417,-11.456 0.419,-12.653 ; 0.5,5.084 0.5,4.919 cw(c0.527,4.76) 0.686,4.786 1.245,4.786 1.245,4.481 0.914,4.481 cw(c0.813,4.304) 0.991,4.202 1.321,4.202 1.321,3.999 0.991,3.999 cw(c0.14,3.986) 0.152,3.135 0.152,2.83 -0.152,2.83 -0.152,3.135 cw(c-0.14,3.986) -0.991,3.999 -1.321,3.999 -1.321,4.202 -0.991,4.202 cw(c-0.813,4.304) -0.914,4.481 -1.245,4.481 -1.245,4.786 -0.686,4.786 cw(c-0.528,4.758) -0.5,4.916 -0.5,5.1 ; 0.645,-11.45 0.648,-12.647 ; 1.2,-12.527 1.079,-12.647 -1.084,-12.647 -1.2,-12.531 -1.2,-9.3 1.2,-9.3 1.2,-12.5 ; 2.498,13.45 2.498,4.45 ; 3.7,2.5 ccw(c3.7,2) 3.7,1.5 ; 3.716,-0.3 3.809,-0.207 ; 4.025,2.5 4.025,3.411 ; 5.958,-5.25 1.7,-5.25 ; -5.5,3.411 -5.5,2.8 ccw(c-5.2,2.8) -5.2,2.5 5.2,2.5 ccw(c5.2,2.8) 5.5,2.8 5.5,3.411 ; -5.5,3.411 -4.025,3.411 ; -5.5,3.411 -5.5,4.45 ; -5.5,4.45 -5.5,13.45 5.5,13.45 5.5,4.45 ; -4.742,-2.95 4.742,-2.95 ; -4.742,-2.95 -4.75,-0.3 4.75,-0.3 4.742,-2.95 ; -4.742,-2.95 -6,-4.607 -6,-5.45 -6,-13.75 6,-13.75 6,-5.45 6,-4.607 4.742,-2.95 ; -3.7,1.5 3.7,1.5 ; -3.7,1.5 -4.65,1.5 ccw(c-4.65,1.3) -4.85,1.3 -4.85,0.017 ccw(c-4.65,0.017) -4.65,-0.183 -3.7,-0.183 3.7,-0.183 4.65,-0.183 ccw(c4.65,0.017) 4.85,0.017 4.85,1.3 ccw(c4.65,1.3) 4.65,1.5 3.7,1.5 ; -1.7,-5.25 1.7,-5.25 ; -1.7,-5.25 -1.7,-4.4 1.7,-4.4 1.7,-5.25 ; -0.5,5.1 0.5,5.1 0.5,5.9 -0.5,5.9 -0.5,5.1 ; 2.498,4.45 4.025,3.411 ; 2.498,4.45 5.5,4.45 ; 4.025,3.411 5.5,3.411 ; 5.5,3.411 5.5,4.45 ; -1.3,5.1 cw(c-0.7,5.1) -0.7,5.7 -0.7,5.1 -1.3,5.1 ; -0.75,0.562 -0.75,0.75 0.75,0.75 0.75,0.562 0.271,0.375 0.495,0.562 -0.75,0.562 ; 0.7,5.1 0.7,5.7 cw(c0.7,5.1) 1.3,5.1 0.7,5.1
  text ".Designator" at -2.147,10.711 h2.69
Mechanical 15:
  lines w0.05: -6.1,2.275 6.096,2.275 ; -6.1,-13.85 -6.1,13.725 6.1,13.725 6.1,-13.85 -6.1,-13.85
  lines w0.1: -0.5,0 0.5,0 ; 0,-0.5 0,0.5
3D body "d4s20g-400A5-A.stp": height 13.63, standoff -2.87, extent -6,-13.75 6,13.45

## ROS-D4S20G-400A5-B_V [mm] "HSD Right Angle Plug, 27.2x12x10.6mm, Rosenberger Recommended"
height 10.6
pads (8):
  round 1.45 hole 1.05: 1(-1,9) 2(-1,7) 3(1,7) 4(1,9)
  round 2.25 hole 1.75: MH(-4.5,3.5) MH(-4.5,12.5) MH(4.5,3.5) MH(4.5,12.5)
Top Overlay:
  lines w0.2: -5.461,4.684 -5.461,11.316 ; -3.316,2.539 3.316,2.539 ; -3.316,13.461 3.316,13.461 ; 5.461,4.684 5.461,11.316
Mechanical 3:
  lines w0.1: -5.7,0 5.7,0
  text "Board Edge" at -5.6,-0.7 h0.2
Mechanical 13:
  circle w0.1: c-0.002,4.102 r0.65
  lines w0.1: -5.958,-5.25 -1.7,-5.25 ; -4.025,2.5 -4.025,3.411 ; -3.853,-0.2 -3.734,-0.3 ; -3.7,2.5 cw(c-3.7,2) -3.7,1.5 ; -3.19,2.006 3.185,2.006 ; -2.507,4.444 -5.5,4.45 ; -2.498,13.45 -2.498,4.45 -4.025,3.411 ; -1.2,-11.45 1.185,-11.45 cw(c1.185,-11.472) 1.2,-11.456 ; -0.65,-11.45 -0.648,-12.647 ; -0.424,-12.653 -0.422,-11.456 ; 0.417,-11.456 0.419,-12.653 ; 0.5,5.084 0.5,4.919 cw(c0.527,4.76) 0.686,4.786 1.245,4.786 1.245,4.481 0.914,4.481 cw(c0.813,4.304) 0.991,4.202 1.321,4.202 1.321,3.999 0.991,3.999 cw(c0.14,3.986) 0.152,3.135 0.152,2.83 -0.152,2.83 -0.152,3.135 cw(c-0.267,3.402) -0.533,3.288 -1.168,3.288 -1.168,3.592 -0.813,3.592 cw(c-0.699,3.884) -0.991,3.999 -1.321,3.999 -1.321,4.202 -0.991,4.202 cw(c-0.388,4.314) -0.5,4.916 -0.5,5.1 ; 0.645,-11.45 0.648,-12.647 ; 1.2,-12.527 1.079,-12.647 -1.084,-12.647 -1.2,-12.531 -1.2,-9.3 1.2,-9.3 1.2,-12.5 ; 2.498,13.45 2.498,4.45 ; 3.7,2.5 ccw(c3.7,2) 3.7,1.5 ; 3.716,-0.3 3.809,-0.207 ; 4.025,2.5 4.025,3.411 ; 5.958,-5.25 1.7,-5.25 ; -5.5,3.411 -5.5,4.45 ; -5.5,3.411 -4.025,3.411 ; -5.5,3.411 -5.5,2.8 ccw(c-5.2,2.8) -5.2,2.5 5.2,2.5 ccw(c5.2,2.8) 5.5,2.8 5.5,3.411 ; -5.5,4.45 -5.5,13.45 5.5,13.45 5.5,4.45 ; -4.742,-2.95 -6,-4.607 -6,-5.45 -6,-13.75 6,-13.75 6,-5.45 6,-4.607 4.742,-2.95 ; -4.742,-2.95 -4.75,-0.3 4.75,-0.3 4.742,-2.95 ; -4.742,-2.95 4.742,-2.95 ; -3.7,1.5 -4.65,1.5 ccw(c-4.65,1.3) -4.85,1.3 -4.85,0.017 ccw(c-4.65,0.017) -4.65,-0.183 -3.7,-0.183 3.7,-0.183 4.65,-0.183 ccw(c4.65,0.017) 4.85,0.017 4.85,1.3 ccw(c4.65,1.3) 4.65,1.5 3.7,1.5 ; -3.7,1.5 3.7,1.5 ; -1.7,-5.25 -1.7,-4.4 1.7,-4.4 1.7,-5.25 ; -1.7,-5.25 1.7,-5.25 ; -0.5,5.1 -0.5,5.9 0.5,5.9 0.5,5.1 -0.5,5.1 ; 2.498,4.45 5.5,4.45 ; 2.498,4.45 4.025,3.411 ; 4.025,3.411 5.5,3.411 ; 5.5,3.411 5.5,4.45 ; -1.3,5.1 cw(c-0.7,5.1) -0.7,5.7 -0.7,5.1 -1.3,5.1 ; -0.75,0.562 0.495,0.562 0.271,0.375 0.75,0.562 0.75,0.75 -0.75,0.75 -0.75,0.562 ; 0.7,5.1 1.3,5.1 ccw(c0.7,5.1) 0.7,5.7 0.7,5.1
  text ".Designator" at -2.147,10.838 h2.69
Mechanical 15:
  lines w0.05: -6.1,2.275 6.096,2.275 ; -6.1,-13.85 6.1,-13.85 6.1,13.725 -6.1,13.725 -6.1,-13.85
  lines w0.1: -0.5,0 0.5,0 ; 0,-0.5 0,0.5
3D body "d4s20g-400A5-B.stp": height 13.63, standoff -2.87, extent -6,-13.75 6,13.45